# Altium footprint library Package_DFN_QFN.PcbLib: 557 footprints (part 25 of 35)
Each footprint in its own frame and in the unit in brackets; x right, y up, seen from the top. Pads: shape width x height; smd on the part's side, far side on the other; paste and mask are expansions set on the pad; w line width, h text height; cw(c..) or ccw(c..) is an arc to the next point about the centre after c.
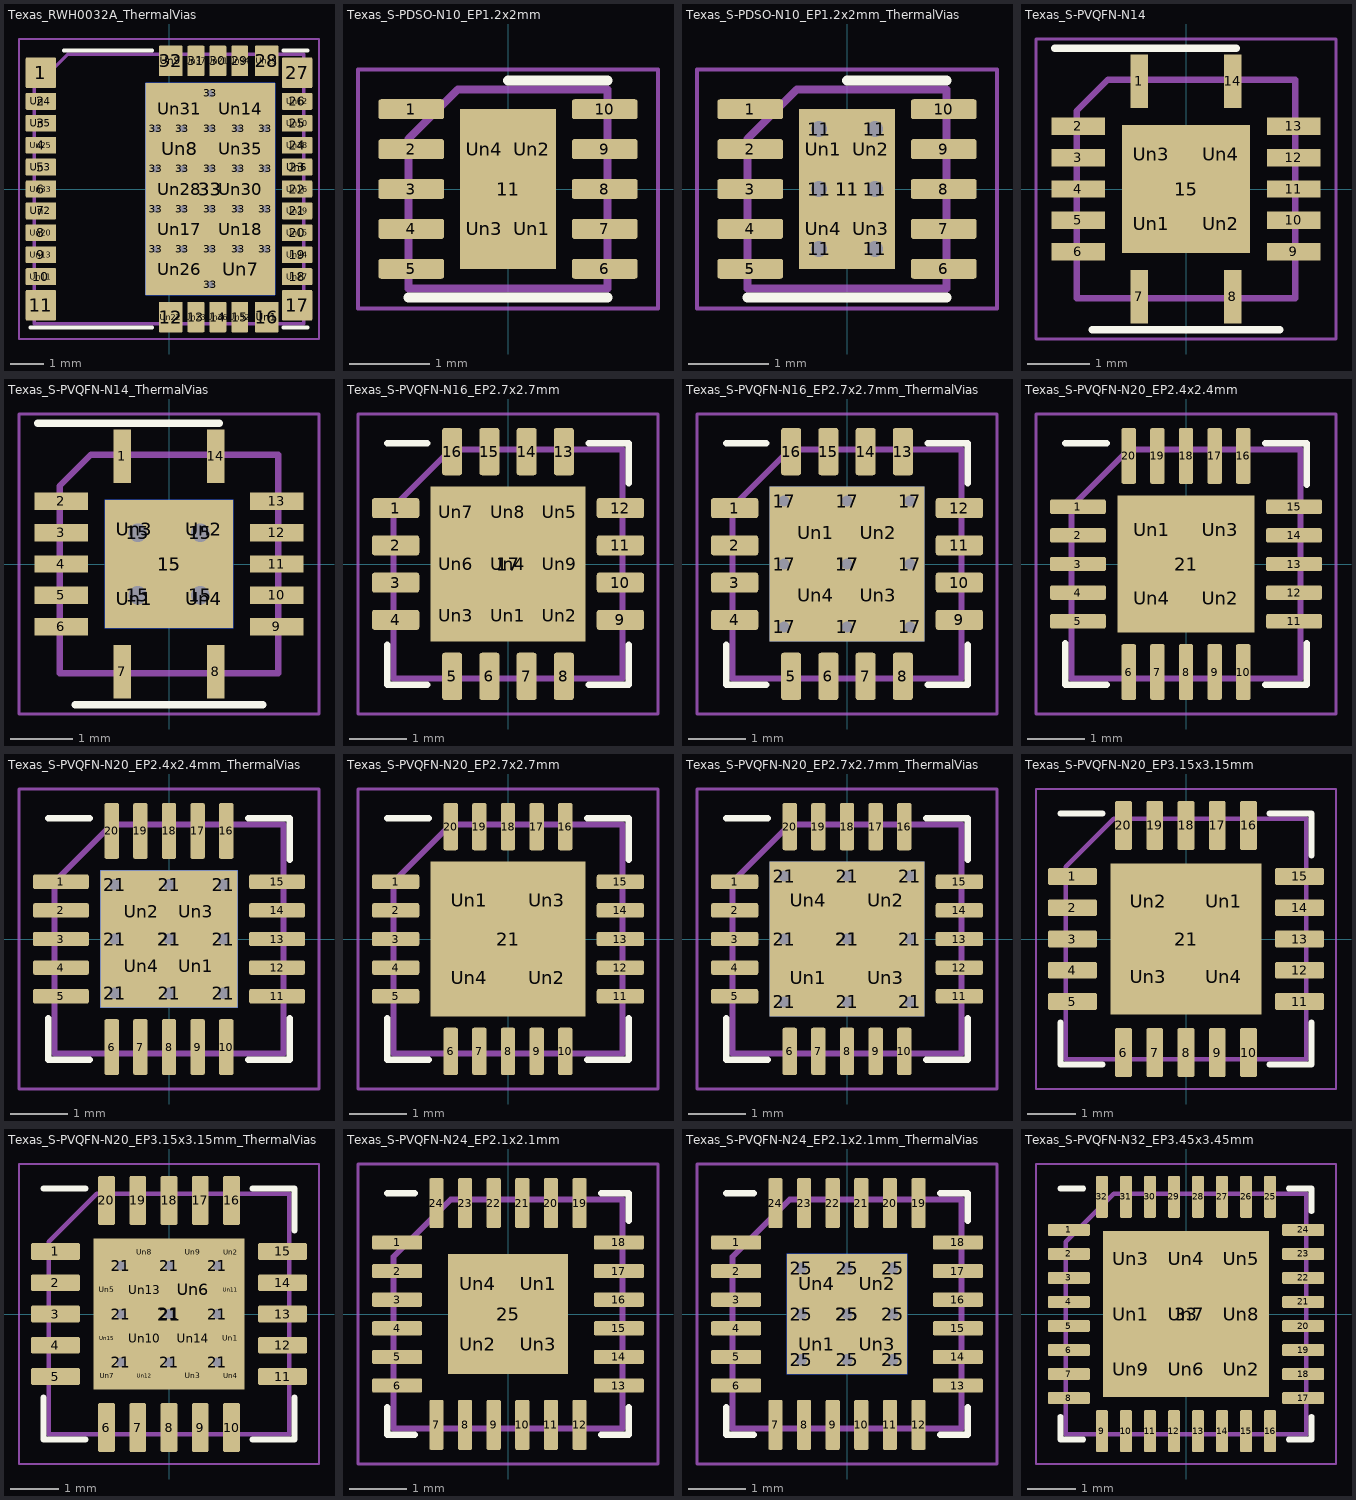
[diagram p24: the footprints below, top view; thin cyan lines are the x and y axes]

## Texas_RWH0032A_ThermalVias [mm]
pads (94):
  rrect6% 0.9x0.9 smd: 1(-3.8,3.45) 11(-3.8,-3.45) 17(3.8,-3.45) 27(3.8,3.45)
  rrect10% 0.9x0.5 smd: 2(-3.8,2.6) 3(-3.8,1.95) 4(-3.8,1.3) 5(-3.8,0.65) 6(-3.8,0) 7(-3.8,-0.65) 8(-3.8,-1.3) 9(-3.8,-1.95) 10(-3.8,-2.6) 18(3.8,-2.6) 19(3.8,-1.95) 20(3.8,-1.3) 21(3.8,-0.65) 22(3.8,0) 23(3.8,0.65) 24(3.8,1.3) 25(3.8,1.95) 26(3.8,2.6)
  rrect7% 0.7x0.9 smd: 12(0.05,-3.8) 16(2.9,-3.8) 28(2.9,3.8) 32(0.05,3.8)
  rrect10% 0.5x0.9 smd: 13(0.8,-3.8) 14(1.45,-3.8) 15(2.1,-3.8) 29(2.1,3.8) 30(1.45,3.8) 31(0.8,3.8)
  round 0.5 hole 0.2: 33(-0.4,-1.785) 33(-0.4,-0.595) 33(-0.4,0.595) 33(-0.4,1.785) 33(0.4,-1.785) 33(0.4,-0.595) 33(0.4,0.595) 33(0.4,1.785) 33(1.225,-2.835) 33(1.225,-1.785) 33(1.225,-0.595) 33(1.225,0.595) 33(1.225,1.785) 33(1.225,2.835) 33(2.05,-1.785) 33(2.05,-0.595) 33(2.05,0.595) 33(2.05,1.785) 33(2.85,-1.785) 33(2.85,-0.595) 33(2.85,0.595) 33(2.85,1.785)
  rrect1% 3.85x6.3 smd: 33(1.225,0)
  rrect1% 3.85x6.3 smd far side: 33(1.225,0)
  rrect8% 0.6x0.76 on Top Paste: Un1(2.9,-3.8) Un9(0.05,3.8) Un19(2.9,3.8) Un22(0.05,-3.8)
  rrect12% 0.76x0.4 on Top Paste: Un2(-3.8,-0.65) Un3(-3.8,0.65) Un4(-3.8,2.6) Un5(-3.8,1.95) Un6(3.8,0.65) Un10(3.8,1.95) Un11(-3.8,-2.6) Un12(3.8,2.6) Un13(-3.8,-1.95) Un15(3.8,-1.3) Un16(3.8,0) Un20(-3.8,-1.3) Un24(3.8,-1.95) Un25(-3.8,1.3) Un27(3.8,-2.6) Un29(3.8,-0.65) Un33(-3.8,0) Un38(3.8,1.3)
  rrect5% 1.6x0.99 on Top Paste: Un7(2.125,-2.38) Un8(0.325,1.19) Un14(2.125,2.38) Un17(0.325,-1.19) Un18(2.125,-1.19) Un26(0.325,-2.38) Un28(0.325,0) Un30(2.125,0) Un31(0.325,2.38) Un35(2.125,1.19)
  rrect12% 0.4x0.76 on Top Paste: Un21(1.45,3.8) Un23(0.8,-3.8) Un32(2.1,-3.8) Un34(2.1,3.8) Un36(1.45,-3.8) Un37(0.8,3.8)
F.SilkS:
  lines w0.12: -4.11,-4.11 -0.5,-4.11 ; -3.11,4.11 -0.5,4.11 ; 3.4,-4.11 4.11,-4.11 ; 3.4,4.11 4.11,4.11
F.CrtYd:
  lines w0.05: -4.45,-4.45 4.45,-4.45 4.45,4.45 -4.45,4.45 -4.45,-4.45
F.Fab:
  lines w0.1: -4,-4 4,-4 4,4 -3,4 -4,3 -4,-4
  text "'.Designator'" at -4.047,-0.84 h1

## Texas_S-PDSO-N10_EP1.2x2mm [mm]
pads (15):
  rrect25% 0.825x0.25 smd: 1(-1.212,1) 2(-1.212,0.5) 3(-1.212,0) 4(-1.212,-0.5) 5(-1.212,-1) 6(1.212,-1) 7(1.212,-0.5) 8(1.212,0) 9(1.212,0.5) 10(1.212,1)
  rect 1.2x2 smd: 11(0,0)
  rrect25% 0.48x0.81 on Top Paste: Un1(0.3,-0.5) Un2(0.3,0.5) Un3(-0.3,-0.5) Un4(-0.3,0.5)
F.SilkS:
  lines w0.12: -1.25,-1.36 1.25,-1.36 ; 0,1.36 1.25,1.36
F.CrtYd:
  lines w0.05: -1.88,-1.5 -1.88,1.5 1.88,1.5 1.88,-1.5 -1.88,-1.5
F.Fab:
  lines w0.1: -1.25,-1.25 1.25,-1.25 1.25,1.25 -0.625,1.25 -1.25,0.625 -1.25,-1.25
  text "'.Designator'" at -2.506,-0.518 h0.62

## Texas_S-PDSO-N10_EP1.2x2mm_ThermalVias [mm]
pads (22):
  rrect25% 0.825x0.25 smd: 1(-1.212,1) 2(-1.212,0.5) 3(-1.212,0) 4(-1.212,-0.5) 5(-1.212,-1) 6(1.212,-1) 7(1.212,-0.5) 8(1.212,0) 9(1.212,0.5) 10(1.212,1)
  round 0.5 hole 0.2: 11(-0.35,-0.75) 11(-0.35,0) 11(-0.35,0.75) 11(0.35,-0.75) 11(0.35,0) 11(0.35,0.75)
  rect 1.2x2 smd: 11(0,0)
  rect 1.2x2 smd far side: 11(0,0)
  rrect25% 0.5x0.84 on Top Paste: Un1(-0.3,0.5) Un2(0.3,0.5) Un3(0.3,-0.5) Un4(-0.3,-0.5)
F.SilkS:
  lines w0.12: -1.25,-1.36 1.25,-1.36 ; 0,1.36 1.25,1.36
F.CrtYd:
  lines w0.05: -1.88,-1.5 1.88,-1.5 1.88,1.5 -1.88,1.5 -1.88,-1.5
F.Fab:
  lines w0.1: -1.25,-1.25 1.25,-1.25 1.25,1.25 -0.625,1.25 -1.25,0.625 -1.25,-1.25
  text "'.Designator'" at -2.506,-0.518 h0.62

## Texas_S-PVQFN-N14 [mm]
pads (19):
  rect 0.28x0.85 smd: 1(-0.75,1.725) 7(-0.75,-1.725) 8(0.75,-1.725) 14(0.75,1.725)
  rect 0.85x0.28 smd: 2(-1.725,1) 3(-1.725,0.5) 4(-1.725,0) 5(-1.725,-0.5) 6(-1.725,-1) 9(1.725,-1) 10(1.725,-0.5) 11(1.725,0) 12(1.725,0.5) 13(1.725,1)
  rect 2.05x2.05 smd: 15(0,0)
  rect 0.82x0.82 on Top Paste: Un1(-0.56,-0.56) Un2(0.56,-0.56) Un3(-0.56,0.56) Un4(0.56,0.56)
F.SilkS:
  lines w0.12: -2.1,2.25 0.8,2.25 ; -1.5,-2.25 1.5,-2.25
F.CrtYd:
  lines w0.05: -2.4,-2.4 -2.4,2.4 2.4,2.4 2.4,-2.4 -2.4,-2.4
F.Fab:
  lines w0.1: -1.75,-1.75 -1.75,1.25 -1.25,1.75 1.75,1.75 1.75,-1.75 -1.75,-1.75
  text "'.Designator'" at -3.197,-0.632 h0.8

## Texas_S-PVQFN-N14_ThermalVias [mm]
pads (24):
  rect 0.28x0.85 smd: 1(-0.75,1.725) 7(-0.75,-1.725) 8(0.75,-1.725) 14(0.75,1.725)
  rect 0.85x0.28 smd: 2(-1.725,1) 3(-1.725,0.5) 4(-1.725,0) 5(-1.725,-0.5) 6(-1.725,-1) 9(1.725,-1) 10(1.725,-0.5) 11(1.725,0) 12(1.725,0.5) 13(1.725,1)
  round 0.6 hole 0.3: 15(-0.5,-0.5) 15(-0.5,0.5) 15(0.5,-0.5) 15(0.5,0.5)
  rect 2.05x2.05 smd far side: 15(0,0)
  rect 2.05x2.05 smd: 15(0,0)
  rect 0.82x0.82 on Top Paste: Un1(-0.56,-0.56) Un2(0.56,0.56) Un3(-0.56,0.56) Un4(0.56,-0.56)
F.SilkS:
  lines w0.12: -2.1,2.25 0.8,2.25 ; -1.5,-2.25 1.5,-2.25
F.CrtYd:
  lines w0.05: -2.4,-2.4 -2.4,2.4 2.4,2.4 2.4,-2.4 -2.4,-2.4
F.Fab:
  lines w0.1: -1.75,-1.75 1.75,-1.75 1.75,1.75 -1.25,1.75 -1.75,1.25 -1.75,-1.75
  text "'.Designator'" at -3.197,-0.632 h0.8

## Texas_S-PVQFN-N16_EP2.7x2.7mm [mm]
pads (26):
  rrect25% 0.825x0.35 smd: 1(-1.963,0.975) 2(-1.963,0.325) 3(-1.963,-0.325) 4(-1.963,-0.975) 9(1.963,-0.975) 10(1.963,-0.325) 11(1.963,0.325) 12(1.963,0.975)
  rrect25% 0.35x0.825 smd: 5(-0.975,-1.963) 6(-0.325,-1.963) 7(0.325,-1.963) 8(0.975,-1.963) 13(0.975,1.963) 14(0.325,1.963) 15(-0.325,1.963) 16(-0.975,1.963)
  rect 2.7x2.7 smd: 17(0,0)
  rrect25% 0.73x0.73 on Top Paste: Un1(0,-0.9) Un2(0.9,-0.9) Un3(-0.9,-0.9) Un4(0,0) Un5(0.9,0.9) Un6(-0.9,0) Un7(-0.9,0.9) Un8(0,0.9) Un9(0.9,0)
F.SilkS:
  lines w0.12: -2.11,-1.41 -2.11,-2.11 -1.41,-2.11 ; -2.11,2.11 -1.41,2.11 ; 1.41,-2.11 2.11,-2.11 2.11,-1.41 ; 1.41,2.11 2.11,2.11 2.11,1.41
F.CrtYd:
  lines w0.05: -2.62,-2.62 -2.62,2.62 2.62,2.62 2.62,-2.62 -2.62,-2.62
F.Fab:
  lines w0.1: -2,-2 2,-2 2,2 -1,2 -2,1 -2,-2
  text "'.Designator'" at -4.047,-0.84 h1

## Texas_S-PVQFN-N16_EP2.7x2.7mm_ThermalVias [mm]
pads (31):
  rrect25% 0.825x0.35 smd: 1(-1.963,0.975) 2(-1.963,0.325) 3(-1.963,-0.325) 4(-1.963,-0.975) 9(1.963,-0.975) 10(1.963,-0.325) 11(1.963,0.325) 12(1.963,0.975)
  rrect25% 0.35x0.825 smd: 5(-0.975,-1.963) 6(-0.325,-1.963) 7(0.325,-1.963) 8(0.975,-1.963) 13(0.975,1.963) 14(0.325,1.963) 15(-0.325,1.963) 16(-0.975,1.963)
  round 0.5 hole 0.2: 17(-1.1,-1.1) 17(-1.1,0) 17(-1.1,1.1) 17(0,-1.1) 17(0,0) 17(0,1.1) 17(1.1,-1.1) 17(1.1,0) 17(1.1,1.1)
  rect 2.7x2.7 smd: 17(0,0)
  rect 2.7x2.7 smd far side: 17(0,0)
  rrect25% 0.955x0.955 on Top Paste: Un1(-0.55,0.55) Un2(0.55,0.55) Un3(0.55,-0.55) Un4(-0.55,-0.55)
F.SilkS:
  lines w0.12: -2.11,-1.41 -2.11,-2.11 -1.41,-2.11 ; -2.11,2.11 -1.41,2.11 ; 1.41,-2.11 2.11,-2.11 2.11,-1.41 ; 1.41,2.11 2.11,2.11 2.11,1.41
F.CrtYd:
  lines w0.05: -2.62,-2.62 2.62,-2.62 2.62,2.62 -2.62,2.62 -2.62,-2.62
F.Fab:
  lines w0.1: -2,-2 -2,1 -1,2 2,2 2,-2 -2,-2
  text "'.Designator'" at -4.047,-0.84 h1

## Texas_S-PVQFN-N20_EP2.4x2.4mm [mm]
pads (25):
  rrect25% 0.975x0.25 smd: 1(-1.887,1) 2(-1.887,0.5) 3(-1.887,0) 4(-1.887,-0.5) 5(-1.887,-1) 11(1.887,-1) 12(1.887,-0.5) 13(1.887,0) 14(1.887,0.5) 15(1.887,1)
  rrect25% 0.25x0.975 smd: 6(-1,-1.887) 7(-0.5,-1.887) 8(0,-1.887) 9(0.5,-1.887) 10(1,-1.887) 16(1,1.887) 17(0.5,1.887) 18(0,1.887) 19(-0.5,1.887) 20(-1,1.887)
  rect 2.4x2.4 smd: 21(0,0)
  rrect25% 0.97x0.97 on Top Paste: Un1(-0.6,0.6) Un2(0.6,-0.6) Un3(0.6,0.6) Un4(-0.6,-0.6)
F.SilkS:
  lines w0.12: -2.11,-1.385 -2.11,-2.11 -1.385,-2.11 ; -2.11,2.11 -1.385,2.11 ; 1.385,-2.11 2.11,-2.11 2.11,-1.385 ; 1.385,2.11 2.11,2.11 2.11,1.385
F.CrtYd:
  lines w0.05: -2.62,-2.62 -2.62,2.62 2.62,2.62 2.62,-2.62 -2.62,-2.62
F.Fab:
  lines w0.1: -2,-2 2,-2 2,2 -1,2 -2,1 -2,-2
  text "'.Designator'" at -4.047,-0.84 h1

## Texas_S-PVQFN-N20_EP2.4x2.4mm_ThermalVias [mm]
pads (35):
  rrect25% 0.975x0.25 smd: 1(-1.887,1) 2(-1.887,0.5) 3(-1.887,0) 4(-1.887,-0.5) 5(-1.887,-1) 11(1.887,-1) 12(1.887,-0.5) 13(1.887,0) 14(1.887,0.5) 15(1.887,1)
  rrect25% 0.25x0.975 smd: 6(-1,-1.887) 7(-0.5,-1.887) 8(0,-1.887) 9(0.5,-1.887) 10(1,-1.887) 16(1,1.887) 17(0.5,1.887) 18(0,1.887) 19(-0.5,1.887) 20(-1,1.887)
  round 0.5 hole 0.2: 21(-0.95,-0.95) 21(-0.95,0) 21(-0.95,0.95) 21(0,-0.95) 21(0,0) 21(0,0.95) 21(0.95,-0.95) 21(0.95,0) 21(0.95,0.95)
  rect 2.4x2.4 smd: 21(0,0)
  rect 2.4x2.4 smd far side: 21(0,0)
  round 0.72 on Top Paste: Un1(0.475,-0.475) Un2(-0.475,0.475) Un3(0.475,0.475) Un4(-0.475,-0.475)
F.SilkS:
  lines w0.12: -2.11,-1.385 -2.11,-2.11 -1.385,-2.11 ; -2.11,2.11 -1.385,2.11 ; 1.385,-2.11 2.11,-2.11 2.11,-1.385 ; 1.385,2.11 2.11,2.11 2.11,1.385
F.Paste:
  region: 0.771,-0.285 0.771,-0.665 0.665,-0.771 0.285,-0.771 0.179,-0.665 0.179,-0.285 0.285,-0.179 0.665,-0.179
  region: -0.179,0.665 -0.179,0.285 -0.285,0.179 -0.665,0.179 -0.771,0.285 -0.771,0.665 -0.665,0.771 -0.285,0.771
  region: 0.771,0.665 0.771,0.285 0.665,0.179 0.285,0.179 0.179,0.285 0.179,0.665 0.285,0.771 0.665,0.771
  region: -0.179,-0.285 -0.179,-0.665 -0.285,-0.771 -0.665,-0.771 -0.771,-0.665 -0.771,-0.285 -0.665,-0.179 -0.285,-0.179
F.CrtYd:
  lines w0.05: -2.62,-2.62 2.62,-2.62 2.62,2.62 -2.62,2.62 -2.62,-2.62
F.Fab:
  lines w0.1: -2,-2 2,-2 2,2 -1,2 -2,1 -2,-2
  text "'.Designator'" at -4.047,-0.84 h1

## Texas_S-PVQFN-N20_EP2.7x2.7mm [mm]
pads (25):
  rrect25% 0.825x0.25 smd: 1(-1.963,1) 2(-1.963,0.5) 3(-1.963,0) 4(-1.963,-0.5) 5(-1.963,-1) 11(1.963,-1) 12(1.963,-0.5) 13(1.963,0) 14(1.963,0.5) 15(1.963,1)
  rrect25% 0.25x0.825 smd: 6(-1,-1.963) 7(-0.5,-1.963) 8(0,-1.963) 9(0.5,-1.963) 10(1,-1.963) 16(1,1.963) 17(0.5,1.963) 18(0,1.963) 19(-0.5,1.963) 20(-1,1.963)
  rect 2.7x2.7 smd: 21(0,0)
  rrect23% 1.09x1.09 on Top Paste: Un1(-0.675,0.675) Un2(0.675,-0.675) Un3(0.675,0.675) Un4(-0.675,-0.675)
F.SilkS:
  lines w0.12: -2.11,-1.385 -2.11,-2.11 -1.385,-2.11 ; -2.11,2.11 -1.385,2.11 ; 1.385,-2.11 2.11,-2.11 2.11,-1.385 ; 1.385,2.11 2.11,2.11 2.11,1.385
F.CrtYd:
  lines w0.05: -2.62,-2.62 2.62,-2.62 2.62,2.62 -2.62,2.62 -2.62,-2.62
F.Fab:
  lines w0.1: -2,-2 -2,1 -1,2 2,2 2,-2 -2,-2
  text "'.Designator'" at -4.047,-0.84 h1

## Texas_S-PVQFN-N20_EP2.7x2.7mm_ThermalVias [mm]
pads (35):
  rrect25% 0.825x0.25 smd: 1(-1.963,1) 2(-1.963,0.5) 3(-1.963,0) 4(-1.963,-0.5) 5(-1.963,-1) 11(1.963,-1) 12(1.963,-0.5) 13(1.963,0) 14(1.963,0.5) 15(1.963,1)
  rrect25% 0.25x0.825 smd: 6(-1,-1.963) 7(-0.5,-1.963) 8(0,-1.963) 9(0.5,-1.963) 10(1,-1.963) 16(1,1.963) 17(0.5,1.963) 18(0,1.963) 19(-0.5,1.963) 20(-1,1.963)
  round 0.5 hole 0.2: 21(-1.1,-1.1) 21(-1.1,0) 21(-1.1,1.1) 21(0,-1.1) 21(0,0) 21(0,1.1) 21(1.1,-1.1) 21(1.1,0) 21(1.1,1.1)
  rect 2.7x2.7 smd: 21(0,0)
  rect 2.7x2.7 smd far side: 21(0,0)
  rrect22% 1.13x1.13 on Top Paste: Un1(-0.675,-0.675) Un2(0.675,0.675) Un3(0.675,-0.675) Un4(-0.675,0.675)
F.SilkS:
  lines w0.12: -2.11,-1.385 -2.11,-2.11 -1.385,-2.11 ; -2.11,2.11 -1.385,2.11 ; 1.385,-2.11 2.11,-2.11 2.11,-1.385 ; 1.385,2.11 2.11,2.11 2.11,1.385
F.CrtYd:
  lines w0.05: -2.62,-2.62 2.62,-2.62 2.62,2.62 -2.62,2.62 -2.62,-2.62
F.Fab:
  lines w0.1: -2,-2 2,-2 2,2 -1,2 -2,1 -2,-2
  text "'.Designator'" at -4.047,-0.84 h1

## Texas_S-PVQFN-N20_EP3.15x3.15mm [mm]
pads (25):
  rrect25% 1.025x0.35 smd: 1(-2.362,1.3) 2(-2.362,0.65) 3(-2.362,0) 4(-2.362,-0.65) 5(-2.362,-1.3) 11(2.362,-1.3) 12(2.362,-0.65) 13(2.362,0) 14(2.362,0.65) 15(2.362,1.3)
  rrect25% 0.35x1.025 smd: 6(-1.3,-2.362) 7(-0.65,-2.362) 8(0,-2.362) 9(0.65,-2.362) 10(1.3,-2.362) 16(1.3,2.362) 17(0.65,2.362) 18(0,2.362) 19(-0.65,2.362) 20(-1.3,2.362)
  rect 3.15x3.15 smd: 21(0,0)
  rrect20% 1.27x1.27 on Top Paste: Un1(0.79,0.79) Un2(-0.79,0.79) Un3(-0.79,-0.79) Un4(0.79,-0.79)
F.SilkS:
  lines w0.12: -2.61,-1.735 -2.61,-2.61 -1.735,-2.61 ; -2.61,2.61 -1.735,2.61 ; 1.735,-2.61 2.61,-2.61 2.61,-1.735 ; 1.735,2.61 2.61,2.61 2.61,1.735
F.CrtYd:
  lines w0.05: -3.12,-3.12 3.12,-3.12 3.12,3.12 -3.12,3.12 -3.12,-3.12
F.Fab:
  lines w0.1: -2.5,-2.5 2.5,-2.5 2.5,2.5 -1.5,2.5 -2.5,1.5 -2.5,-2.5
  text "'.Designator'" at -4.047,-0.84 h1

## Texas_S-PVQFN-N20_EP3.15x3.15mm_ThermalVias [mm]
pads (47):
  rrect25% 1.025x0.35 smd: 1(-2.362,1.3) 2(-2.362,0.65) 3(-2.362,0) 4(-2.362,-0.65) 5(-2.362,-1.3) 11(2.362,-1.3) 12(2.362,-0.65) 13(2.362,0) 14(2.362,0.65) 15(2.362,1.3)
  rrect25% 0.35x1.025 smd: 6(-1.3,-2.362) 7(-0.65,-2.362) 8(0,-2.362) 9(0.65,-2.362) 10(1.3,-2.362) 16(1.3,2.362) 17(0.65,2.362) 18(0,2.362) 19(-0.65,2.362) 20(-1.3,2.362)
  round 0.5 hole 0.2: 21(-1,-1) 21(-1,0) 21(-1,1) 21(0,-1) 21(0,0) 21(0,1) 21(1,-1) 21(1,0) 21(1,1)
  rect 3.15x3.15 smd: 21(0,0)
  rect 2.5x2.5 smd far side: 21(0,0)
  round 0.371 on Top Paste: Un1(1.288,-0.5) Un3(0.5,-1.288) Un5(-1.288,0.5) Un8(-0.5,1.288) Un9(0.5,1.288) Un11(1.288,0.5) Un12(-0.5,-1.288) Un15(-1.288,-0.5)
  round 0.342 on Top Paste: Un2(1.288,1.288) Un4(1.288,-1.288) Un7(-1.288,-1.288) Un16(-1.288,1.288)
  rrect25% 0.806x0.806 on Top Paste: Un6(0.5,0.5) Un10(-0.5,-0.5) Un13(-0.5,0.5) Un14(0.5,-0.5)
F.SilkS:
  lines w0.12: -2.61,-1.735 -2.61,-2.61 -1.735,-2.61 ; -2.61,2.61 -1.735,2.61 ; 1.735,-2.61 2.61,-2.61 2.61,-1.735 ; 1.735,2.61 2.61,2.61 2.61,1.735
F.Paste:
  region: 1.427,-0.811 1.224,-0.811 1.148,-0.735 1.148,-0.265 1.224,-0.189 1.427,-0.189
  region: 1.403,1.172 1.275,1.172 1.172,1.275 1.172,1.403 1.403,1.403
  region: 0.811,-1.224 0.811,-1.427 0.189,-1.427 0.189,-1.224 0.265,-1.148 0.735,-1.148
  region: 1.403,-1.403 1.172,-1.403 1.172,-1.275 1.275,-1.172 1.403,-1.172
  region: -1.148,0.735 -1.148,0.265 -1.224,0.189 -1.427,0.189 -1.427,0.811 -1.224,0.811
  region: -1.172,-1.275 -1.172,-1.403 -1.403,-1.403 -1.403,-1.172 -1.275,-1.172
  region: -0.189,1.224 -0.265,1.148 -0.735,1.148 -0.811,1.224 -0.811,1.427 -0.189,1.427
  region: 0.811,1.224 0.735,1.148 0.265,1.148 0.189,1.224 0.189,1.427 0.811,1.427
  region: 1.427,0.189 1.224,0.189 1.148,0.265 1.148,0.735 1.224,0.811 1.427,0.811
  region: -0.189,-1.224 -0.189,-1.427 -0.811,-1.427 -0.811,-1.224 -0.735,-1.148 -0.265,-1.148
  region: -1.148,-0.265 -1.148,-0.735 -1.224,-0.811 -1.427,-0.811 -1.427,-0.189 -1.224,-0.189
  region: -1.172,1.275 -1.275,1.172 -1.403,1.172 -1.403,1.403 -1.172,1.403
F.CrtYd:
  lines w0.05: -3.12,-3.12 3.12,-3.12 3.12,3.12 -3.12,3.12 -3.12,-3.12
F.Fab:
  lines w0.1: -2.5,-2.5 2.5,-2.5 2.5,2.5 -1.5,2.5 -2.5,1.5 -2.5,-2.5
  text "'.Designator'" at -4.047,-0.84 h1

## Texas_S-PVQFN-N24_EP2.1x2.1mm [mm]
pads (29):
  rrect25% 0.875x0.25 smd: 1(-1.937,1.25) 2(-1.937,0.75) 3(-1.937,0.25) 4(-1.937,-0.25) 5(-1.937,-0.75) 6(-1.937,-1.25) 13(1.937,-1.25) 14(1.937,-0.75) 15(1.937,-0.25) 16(1.937,0.25) 17(1.937,0.75) 18(1.937,1.25)
  rrect25% 0.25x0.875 smd: 7(-1.25,-1.937) 8(-0.75,-1.937) 9(-0.25,-1.937) 10(0.25,-1.937) 11(0.75,-1.937) 12(1.25,-1.937) 19(1.25,1.937) 20(0.75,1.937) 21(0.25,1.937) 22(-0.25,1.937) 23(-0.75,1.937) 24(-1.25,1.937)
  rect 2.1x2.1 smd: 25(0,0)
  rrect25% 0.85x0.85 on Top Paste: Un1(0.525,0.525) Un2(-0.525,-0.525) Un3(0.525,-0.525) Un4(-0.525,0.525)
F.SilkS:
  lines w0.12: -2.11,-1.635 -2.11,-2.11 -1.635,-2.11 ; -2.11,2.11 -1.635,2.11 ; 1.635,-2.11 2.11,-2.11 2.11,-1.635 ; 1.635,2.11 2.11,2.11 2.11,1.635
F.CrtYd:
  lines w0.05: -2.62,-2.62 -2.62,2.62 2.62,2.62 2.62,-2.62 -2.62,-2.62
F.Fab:
  lines w0.1: -2,-2 -2,1 -1,2 2,2 2,-2 -2,-2
  text "'.Designator'" at -4.047,-0.84 h1

## Texas_S-PVQFN-N24_EP2.1x2.1mm_ThermalVias [mm]
pads (39):
  rrect25% 0.875x0.25 smd: 1(-1.937,1.25) 2(-1.937,0.75) 3(-1.937,0.25) 4(-1.937,-0.25) 5(-1.937,-0.75) 6(-1.937,-1.25) 13(1.937,-1.25) 14(1.937,-0.75) 15(1.937,-0.25) 16(1.937,0.25) 17(1.937,0.75) 18(1.937,1.25)
  rrect25% 0.25x0.875 smd: 7(-1.25,-1.937) 8(-0.75,-1.937) 9(-0.25,-1.937) 10(0.25,-1.937) 11(0.75,-1.937) 12(1.25,-1.937) 19(1.25,1.937) 20(0.75,1.937) 21(0.25,1.937) 22(-0.25,1.937) 23(-0.75,1.937) 24(-1.25,1.937)
  round 0.5 hole 0.2: 25(-0.8,-0.8) 25(-0.8,0) 25(-0.8,0.8) 25(0,-0.8) 25(0,0) 25(0,0.8) 25(0.8,-0.8) 25(0.8,0) 25(0.8,0.8)
  rect 2.1x2.1 smd: 25(0,0)
  rect 2.1x2.1 smd far side: 25(0,0)
  rrect25% 0.88x0.88 on Top Paste: Un1(-0.525,-0.525) Un2(0.525,0.525) Un3(0.525,-0.525) Un4(-0.525,0.525)
F.SilkS:
  lines w0.12: -2.11,-1.635 -2.11,-2.11 -1.635,-2.11 ; -2.11,2.11 -1.635,2.11 ; 1.635,-2.11 2.11,-2.11 2.11,-1.635 ; 1.635,2.11 2.11,2.11 2.11,1.635
F.CrtYd:
  lines w0.05: -2.62,-2.62 -2.62,2.62 2.62,2.62 2.62,-2.62 -2.62,-2.62
F.Fab:
  lines w0.1: -2,-2 2,-2 2,2 -1,2 -2,1 -2,-2
  text "'.Designator'" at -4.047,-0.84 h1

## Texas_S-PVQFN-N32_EP3.45x3.45mm [mm]
pads (42):
  rrect25% 0.875x0.25 smd: 1(-2.438,1.75) 2(-2.438,1.25) 3(-2.438,0.75) 4(-2.438,0.25) 5(-2.438,-0.25) 6(-2.438,-0.75) 7(-2.438,-1.25) 8(-2.438,-1.75) 17(2.438,-1.75) 18(2.438,-1.25) 19(2.438,-0.75) 20(2.438,-0.25) 21(2.438,0.25) 22(2.438,0.75) 23(2.438,1.25) 24(2.438,1.75)
  rrect25% 0.25x0.875 smd: 9(-1.75,-2.438) 10(-1.25,-2.438) 11(-0.75,-2.438) 12(-0.25,-2.438) 13(0.25,-2.438) 14(0.75,-2.438) 15(1.25,-2.438) 16(1.75,-2.438) 25(1.75,2.438) 26(1.25,2.438) 27(0.75,2.438) 28(0.25,2.438) 29(-0.25,2.438) 30(-0.75,2.438) 31(-1.25,2.438) 32(-1.75,2.438)
  rect 3.45x3.45 smd: 33(0,0)
  rrect25% 0.93x0.93 on Top Paste: Un1(-1.15,0) Un2(1.15,-1.15) Un3(-1.15,1.15) Un4(0,1.15) Un5(1.15,1.15) Un6(0,-1.15) Un7(0,0) Un8(1.15,0) Un9(-1.15,-1.15)
F.SilkS:
  lines w0.12: -2.61,-2.135 -2.61,-2.61 -2.135,-2.61 ; -2.61,2.61 -2.135,2.61 ; 2.135,-2.61 2.61,-2.61 2.61,-2.135 ; 2.135,2.61 2.61,2.61 2.61,2.135
F.CrtYd:
  lines w0.05: -3.12,-3.12 3.12,-3.12 3.12,3.12 -3.12,3.12 -3.12,-3.12
F.Fab:
  lines w0.1: -2.5,-2.5 2.5,-2.5 2.5,2.5 -1.5,2.5 -2.5,1.5 -2.5,-2.5
  text "'.Designator'" at -4.047,-0.84 h1